# Altium schematic symbol library jlcpcb_2025_04_inductors_extended_0402.schlib: 1396 symbols (part 8 of 8)
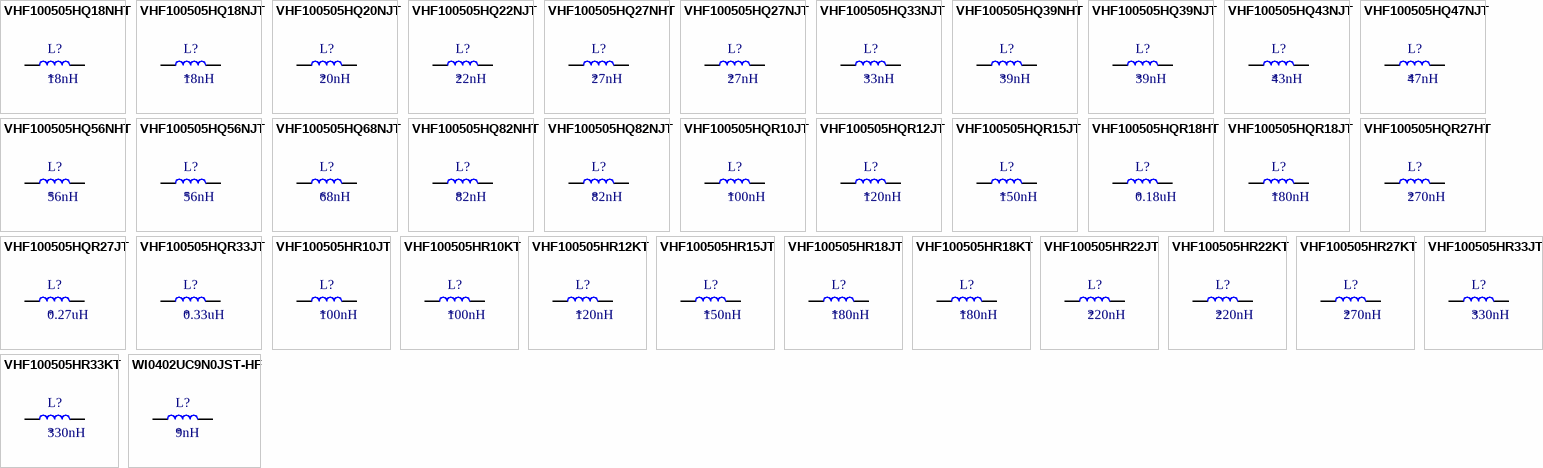
[diagram p41: symbols VHF100505HQ18NHT to WI0402UC9N0JST-HF]

## VHF100505HQ47NJT
designator L?  Inductance: 47nH
Inductor, 47nH, ±5%, 1.1Ω, 200mA, SMD 0402; Manufacturer: FH(Guangdong Fenghua Advanced Tech); Manufacturer Part Number: VHF100505HQ47NJT; Package Size: 0402; JLCPCB Basic Part: No; JLCPCB Part Number: C395068; Supplier 1: LCSC; Category: Inductors; Supplier Part Number 1: C395068; Tolerance: ±5%; Rated Current: 200mA; DC Resistance: 1.1Ω; RoHS: Yes; ComponentLink1Description: Datasheet; ComponentLink1URL: https://wmsc.lcsc.com/wmsc/upload/file/pdf/v2/lcsc/2302231208_FH--Guangdong-Fenghua-Advanced-Tech-VHF100505HQ47NJT_C395068.pdf; ComponentLink2Description: JLCPCB Part URL; ComponentLink2URL: https://jlcpcb.com/partdetail/C395068; ComponentLink3Description: LCSC Part URL; ComponentLink3URL: https://lcsc.com/product-detail/Inductors-SMD_FH-Guangdong-Fenghua-Advanced-Tech-FH-Guangdong-Fenghua-Advanced-Tech-VHF100505HQ47NJT_C395068.html
footprint IND-0402 (0402 (1005M) Inductor)
pins: 1, 2

## VHF100505HQ56NHT
designator L?  Inductance: 56nH
Inductor, 56nH, ±3%, SMD 0402; Manufacturer: FH (Guangdong Fenghua Advanced Tech); Manufacturer Part Number: VHF100505HQ56NHT; Package Size: 0402; JLCPCB Basic Part: No; JLCPCB Part Number: C3032793; Supplier 1: LCSC; Category: Inductors; Supplier Part Number 1: C3032793; Tolerance: ±3%; RoHS: Yes; ComponentLink1Description: Datasheet; ComponentLink1URL: https://wmsc.lcsc.com/wmsc/upload/file/pdf/v2/lcsc/2302231130_FH--Guangdong-Fenghua-Advanced-Tech-VHF100505HQ56NHT_C3032793.pdf; ComponentLink2Description: JLCPCB Part URL; ComponentLink2URL: https://jlcpcb.com/partdetail/C3032793; ComponentLink3Description: LCSC Part URL; ComponentLink3URL: https://lcsc.com/product-detail/Inductors-SMD_FH-Guangdong-Fenghua-Advanced-Tech-FH-Guangdong-Fenghua-Advanced-Tech-VHF100505HQ56NHT_C3032793.html
footprint IND-0402 (0402 (1005M) Inductor)
pins: 1, 2

## VHF100505HQ56NJT
designator L?  Inductance: 56nH
Inductor, 56nH, ±5%, 1.2Ω, 200mA, SMD 0402; Manufacturer: FH(Guangdong Fenghua Advanced Tech); Manufacturer Part Number: VHF100505HQ56NJT; Package Size: 0402; JLCPCB Basic Part: No; JLCPCB Part Number: C395071; Supplier 1: LCSC; Category: Inductors; Supplier Part Number 1: C395071; Tolerance: ±5%; Rated Current: 200mA; DC Resistance: 1.2Ω; RoHS: Yes; ComponentLink1Description: Datasheet; ComponentLink1URL: https://wmsc.lcsc.com/wmsc/upload/file/pdf/v2/lcsc/2302231208_FH--Guangdong-Fenghua-Advanced-Tech-VHF100505HQ56NJT_C395071.pdf; ComponentLink2Description: JLCPCB Part URL; ComponentLink2URL: https://jlcpcb.com/partdetail/C395071; ComponentLink3Description: LCSC Part URL; ComponentLink3URL: https://lcsc.com/product-detail/Inductors-SMD_FH-Guangdong-Fenghua-Advanced-Tech-FH-Guangdong-Fenghua-Advanced-Tech-VHF100505HQ56NJT_C395071.html
footprint IND-0402 (0402 (1005M) Inductor)
pins: 1, 2

## VHF100505HQ68NJT
designator L?  Inductance: 68nH
Inductor, 68nH, ±5%, 1.4Ω, 180mA, SMD 0402; Manufacturer: FH(Guangdong Fenghua Advanced Tech); Manufacturer Part Number: VHF100505HQ68NJT; Package Size: 0402; JLCPCB Basic Part: No; JLCPCB Part Number: C391307; Supplier 1: LCSC; Category: Inductors; Supplier Part Number 1: C391307; Tolerance: ±5%; Rated Current: 180mA; DC Resistance: 1.4Ω; RoHS: Yes; ComponentLink1Description: Datasheet; ComponentLink1URL: https://wmsc.lcsc.com/wmsc/upload/file/pdf/v2/lcsc/2302231208_FH--Guangdong-Fenghua-Advanced-Tech-VHF100505HQ68NJT_C391307.pdf; ComponentLink2Description: JLCPCB Part URL; ComponentLink2URL: https://jlcpcb.com/partdetail/C391307; ComponentLink3Description: LCSC Part URL; ComponentLink3URL: https://lcsc.com/product-detail/Inductors-SMD_FH-Guangdong-Fenghua-Advanced-Tech-FH-Guangdong-Fenghua-Advanced-Tech-VHF100505HQ68NJT_C391307.html
footprint IND-0402 (0402 (1005M) Inductor)
pins: 1, 2

## VHF100505HQ82NHT
designator L?  Inductance: 82nH
Inductor, 82nH, ±3%, SMD 0402; Manufacturer: FH (Guangdong Fenghua Advanced Tech); Manufacturer Part Number: VHF100505HQ82NHT; Package Size: 0402; JLCPCB Basic Part: No; JLCPCB Part Number: C3032780; Supplier 1: LCSC; Category: Inductors; Supplier Part Number 1: C3032780; Tolerance: ±3%; RoHS: Yes; ComponentLink1Description: Datasheet; ComponentLink1URL: https://wmsc.lcsc.com/wmsc/upload/file/pdf/v2/lcsc/2302231130_FH--Guangdong-Fenghua-Advanced-Tech-VHF100505HQ82NHT_C3032780.pdf; ComponentLink2Description: JLCPCB Part URL; ComponentLink2URL: https://jlcpcb.com/partdetail/C3032780; ComponentLink3Description: LCSC Part URL; ComponentLink3URL: https://lcsc.com/product-detail/Inductors-SMD_FH-Guangdong-Fenghua-Advanced-Tech-FH-Guangdong-Fenghua-Advanced-Tech-VHF100505HQ82NHT_C3032780.html
footprint IND-0402 (0402 (1005M) Inductor)
pins: 1, 2

## VHF100505HQ82NJT
designator L?  Inductance: 82nH
Inductor, 82nH, ±5%, 2.4Ω, 150mA, SMD 0402; Manufacturer: FH(Guangdong Fenghua Advanced Tech); Manufacturer Part Number: VHF100505HQ82NJT; Package Size: 0402; JLCPCB Basic Part: No; JLCPCB Part Number: C395076; Supplier 1: LCSC; Category: Inductors; Supplier Part Number 1: C395076; Tolerance: ±5%; Rated Current: 150mA; DC Resistance: 2.4Ω; RoHS: Yes; ComponentLink1Description: Datasheet; ComponentLink1URL: https://wmsc.lcsc.com/wmsc/upload/file/pdf/v2/lcsc/2302231208_FH--Guangdong-Fenghua-Advanced-Tech-VHF100505HQ82NJT_C395076.pdf; ComponentLink2Description: JLCPCB Part URL; ComponentLink2URL: https://jlcpcb.com/partdetail/C395076; ComponentLink3Description: LCSC Part URL; ComponentLink3URL: https://lcsc.com/product-detail/Inductors-SMD_FH-Guangdong-Fenghua-Advanced-Tech-FH-Guangdong-Fenghua-Advanced-Tech-VHF100505HQ82NJT_C395076.html
footprint IND-0402 (0402 (1005M) Inductor)
pins: 1, 2

## VHF100505HQR10JT
designator L?  Inductance: 100nH
Inductor, 100nH, ±5%, 2.6Ω, 150mA, SMD 0402; Manufacturer: FH(Guangdong Fenghua Advanced Tech); Manufacturer Part Number: VHF100505HQR10JT; Package Size: 0402; JLCPCB Basic Part: No; JLCPCB Part Number: C395078; Supplier 1: LCSC; Category: Inductors; Supplier Part Number 1: C395078; Tolerance: ±5%; Rated Current: 150mA; DC Resistance: 2.6Ω; RoHS: Yes; ComponentLink1Description: Datasheet; ComponentLink1URL: https://wmsc.lcsc.com/wmsc/upload/file/pdf/v2/lcsc/2302231208_FH--Guangdong-Fenghua-Advanced-Tech-VHF100505HQR10JT_C395078.pdf; ComponentLink2Description: JLCPCB Part URL; ComponentLink2URL: https://jlcpcb.com/partdetail/C395078; ComponentLink3Description: LCSC Part URL; ComponentLink3URL: https://lcsc.com/product-detail/Inductors-SMD_FH-Guangdong-Fenghua-Advanced-Tech-FH-Guangdong-Fenghua-Advanced-Tech-VHF100505HQR10JT_C395078.html
footprint IND-0402 (0402 (1005M) Inductor)
pins: 1, 2

## VHF100505HQR12JT
designator L?  Inductance: 120nH
Inductor, 120nH, ±5%, 2.8Ω, 150mA, SMD 0402; Manufacturer: FH(Guangdong Fenghua Advanced Tech); Manufacturer Part Number: VHF100505HQR12JT; Package Size: 0402; JLCPCB Basic Part: No; JLCPCB Part Number: C268315; Supplier 1: LCSC; Category: Inductors; Supplier Part Number 1: C268315; Tolerance: ±5%; Rated Current: 150mA; DC Resistance: 2.8Ω; RoHS: Yes; ComponentLink1Description: Datasheet; ComponentLink1URL: https://wmsc.lcsc.com/wmsc/upload/file/pdf/v2/lcsc/2302231230_FH--Guangdong-Fenghua-Advanced-Tech-VHF100505HQR12JT_C268315.pdf; ComponentLink2Description: JLCPCB Part URL; ComponentLink2URL: https://jlcpcb.com/partdetail/C268315; ComponentLink3Description: LCSC Part URL; ComponentLink3URL: https://lcsc.com/product-detail/Inductors-SMD_FH-Guangdong-Fenghua-Advanced-Tech-FH-Guangdong-Fenghua-Advanced-Tech-VHF100505HQR12JT_C268315.html
footprint IND-0402 (0402 (1005M) Inductor)
pins: 1, 2

## VHF100505HQR15JT
designator L?  Inductance: 150nH
Inductor, 150nH, ±5%, 3.2Ω, 100mA, SMD 0402; Manufacturer: FH(Guangdong Fenghua Advanced Tech); Manufacturer Part Number: VHF100505HQR15JT; Package Size: 0402; JLCPCB Basic Part: No; JLCPCB Part Number: C268316; Supplier 1: LCSC; Category: Inductors; Supplier Part Number 1: C268316; Tolerance: ±5%; Rated Current: 100mA; DC Resistance: 3.2Ω; RoHS: Yes; ComponentLink1Description: Datasheet; ComponentLink1URL: https://wmsc.lcsc.com/wmsc/upload/file/pdf/v2/lcsc/2302231230_FH--Guangdong-Fenghua-Advanced-Tech-VHF100505HQR15JT_C268316.pdf; ComponentLink2Description: JLCPCB Part URL; ComponentLink2URL: https://jlcpcb.com/partdetail/C268316; ComponentLink3Description: LCSC Part URL; ComponentLink3URL: https://lcsc.com/product-detail/Inductors-SMD_FH-Guangdong-Fenghua-Advanced-Tech-FH-Guangdong-Fenghua-Advanced-Tech-VHF100505HQR15JT_C268316.html
footprint IND-0402 (0402 (1005M) Inductor)
pins: 1, 2

## VHF100505HQR18HT
designator L?  Inductance: 0.18uH
Inductor, 0.18uH, ±3%, SMD 0402; Manufacturer: FH (Guangdong Fenghua Advanced Tech); Manufacturer Part Number: VHF100505HQR18HT; Package Size: 0402; JLCPCB Basic Part: No; JLCPCB Part Number: C3032808; Supplier 1: LCSC; Category: Inductors; Supplier Part Number 1: C3032808; Tolerance: ±3%; RoHS: Yes; ComponentLink1Description: Datasheet; ComponentLink1URL: https://wmsc.lcsc.com/wmsc/upload/file/pdf/v2/lcsc/2302231030_FH--Guangdong-Fenghua-Advanced-Tech-VHF100505HQR18HT_C3032808.pdf; ComponentLink2Description: JLCPCB Part URL; ComponentLink2URL: https://jlcpcb.com/partdetail/C3032808; ComponentLink3Description: LCSC Part URL; ComponentLink3URL: https://lcsc.com/product-detail/Inductors-SMD_FH-Guangdong-Fenghua-Advanced-Tech-FH-Guangdong-Fenghua-Advanced-Tech-VHF100505HQR18HT_C3032808.html
footprint IND-0402 (0402 (1005M) Inductor)
pins: 1, 2

## VHF100505HQR18JT
designator L?  Inductance: 180nH
Inductor, 180nH, ±5%, 3.7Ω, 100mA, SMD 0402; Manufacturer: FH(Guangdong Fenghua Advanced Tech); Manufacturer Part Number: VHF100505HQR18JT; Package Size: 0402; JLCPCB Basic Part: No; JLCPCB Part Number: C395079; Supplier 1: LCSC; Category: Inductors; Supplier Part Number 1: C395079; Tolerance: ±5%; Rated Current: 100mA; DC Resistance: 3.7Ω; RoHS: Yes; ComponentLink1Description: Datasheet; ComponentLink1URL: https://wmsc.lcsc.com/wmsc/upload/file/pdf/v2/lcsc/2302231208_FH--Guangdong-Fenghua-Advanced-Tech-VHF100505HQR18JT_C395079.pdf; ComponentLink2Description: JLCPCB Part URL; ComponentLink2URL: https://jlcpcb.com/partdetail/C395079; ComponentLink3Description: LCSC Part URL; ComponentLink3URL: https://lcsc.com/product-detail/Inductors-SMD_FH-Guangdong-Fenghua-Advanced-Tech-FH-Guangdong-Fenghua-Advanced-Tech-VHF100505HQR18JT_C395079.html
footprint IND-0402 (0402 (1005M) Inductor)
pins: 1, 2

## VHF100505HQR27HT
designator L?  Inductance: 270nH
Inductor, 270nH, ±3%, SMD 0402; Manufacturer: FH (Guangdong Fenghua Advanced Tech); Manufacturer Part Number: VHF100505HQR27HT; Package Size: 0402; JLCPCB Basic Part: No; JLCPCB Part Number: C3032704; Supplier 1: LCSC; Category: Inductors; Supplier Part Number 1: C3032704; Tolerance: ±3%; RoHS: Yes; ComponentLink1Description: Datasheet; ComponentLink1URL: https://wmsc.lcsc.com/wmsc/upload/file/pdf/v2/lcsc/2302231130_FH--Guangdong-Fenghua-Advanced-Tech-VHF100505HQR27HT_C3032704.pdf; ComponentLink2Description: JLCPCB Part URL; ComponentLink2URL: https://jlcpcb.com/partdetail/C3032704; ComponentLink3Description: LCSC Part URL; ComponentLink3URL: https://lcsc.com/product-detail/Inductors-SMD_FH-Guangdong-Fenghua-Advanced-Tech-FH-Guangdong-Fenghua-Advanced-Tech-VHF100505HQR27HT_C3032704.html
footprint IND-0402 (0402 (1005M) Inductor)
pins: 1, 2

## VHF100505HQR27JT
designator L?  Inductance: 0.27uH
Inductor, 0.27uH, ±5%, 4.5Ω, 100mA, SMD 0402; Manufacturer: FH (Guangdong Fenghua Advanced Tech); Manufacturer Part Number: VHF100505HQR27JT; Self-Resonant Frequency: 400MHz; Q Factor: 8@100MHz; Package Size: 0402; JLCPCB Basic Part: No; JLCPCB Part Number: C485774; Supplier 1: LCSC; Category: Inductors; Supplier Part Number 1: C485774; Tolerance: ±5%; Rated Current: 100mA; DC Resistance: 4.5Ω; RoHS: Yes; ComponentLink1Description: Datasheet; ComponentLink1URL: https://wmsc.lcsc.com/wmsc/upload/file/pdf/v2/lcsc/2302231130_FH--Guangdong-Fenghua-Advanced-Tech-VHF100505HQR27JT_C485774.pdf; ComponentLink2Description: JLCPCB Part URL; ComponentLink2URL: https://jlcpcb.com/partdetail/C485774; ComponentLink3Description: LCSC Part URL; ComponentLink3URL: https://lcsc.com/product-detail/Inductors-SMD_FH-Guangdong-Fenghua-Advanced-Tech-FH-Guangdong-Fenghua-Advanced-Tech-VHF100505HQR27JT_C485774.html
footprint IND-0402 (0402 (1005M) Inductor)
pins: 1, 2

## VHF100505HQR33JT
designator L?  Inductance: 0.33uH
Inductor, 0.33uH, ±5%, 7Ω, 50mA, SMD 0402; Manufacturer: FH (Guangdong Fenghua Advanced Tech); Manufacturer Part Number: VHF100505HQR33JT; Self-Resonant Frequency: 350MHz; Q Factor: 6@50MHz; Package Size: 0402; JLCPCB Basic Part: No; JLCPCB Part Number: C485776; Supplier 1: LCSC; Category: Inductors; Supplier Part Number 1: C485776; Tolerance: ±5%; Rated Current: 50mA; DC Resistance: 7Ω; RoHS: Yes; ComponentLink1Description: Datasheet; ComponentLink1URL: https://wmsc.lcsc.com/wmsc/upload/file/pdf/v2/lcsc/2302231130_FH--Guangdong-Fenghua-Advanced-Tech-VHF100505HQR33JT_C485776.pdf; ComponentLink2Description: JLCPCB Part URL; ComponentLink2URL: https://jlcpcb.com/partdetail/C485776; ComponentLink3Description: LCSC Part URL; ComponentLink3URL: https://lcsc.com/product-detail/Inductors-SMD_FH-Guangdong-Fenghua-Advanced-Tech-FH-Guangdong-Fenghua-Advanced-Tech-VHF100505HQR33JT_C485776.html
footprint IND-0402 (0402 (1005M) Inductor)
pins: 1, 2

## VHF100505HR10JT
designator L?  Inductance: 100nH
Inductor, 100nH, ±5%, SMD 0402; Manufacturer: FH(Guangdong Fenghua Advanced Tech); Manufacturer Part Number: VHF100505HR10JT; Package Size: 0402; JLCPCB Basic Part: No; JLCPCB Part Number: C90184; Supplier 1: LCSC; Category: Inductors; Supplier Part Number 1: C90184; Tolerance: ±5%; RoHS: Yes; ComponentLink1Description: Datasheet; ComponentLink1URL: https://wmsc.lcsc.com/wmsc/upload/file/pdf/v2/lcsc/2304140030_FH--Guangdong-Fenghua-Advanced-Tech-VHF100505HR10JT_C90184.pdf; ComponentLink2Description: JLCPCB Part URL; ComponentLink2URL: https://jlcpcb.com/partdetail/C90184; ComponentLink3Description: LCSC Part URL; ComponentLink3URL: https://lcsc.com/product-detail/Inductors-SMD_FH-Guangdong-Fenghua-Advanced-Tech-FH-Guangdong-Fenghua-Advanced-Tech-VHF100505HR10JT_C90184.html
footprint IND-0402 (0402 (1005M) Inductor)
pins: 1, 2

## VHF100505HR10KT
designator L?  Inductance: 100nH
Inductor, 100nH, ±10%, 2.6Ω, 150mA, SMD 0402; Manufacturer: FH(Guangdong Fenghua Advanced Tech); Manufacturer Part Number: VHF100505HR10KT; Package Size: 0402; JLCPCB Basic Part: No; JLCPCB Part Number: C381892; Supplier 1: LCSC; Category: Inductors; Supplier Part Number 1: C381892; Tolerance: ±10%; Rated Current: 150mA; DC Resistance: 2.6Ω; RoHS: Yes; ComponentLink1Description: Datasheet; ComponentLink1URL: https://wmsc.lcsc.com/wmsc/upload/file/pdf/v2/lcsc/2304140030_FH--Guangdong-Fenghua-Advanced-Tech-VHF100505HR10KT_C381892.pdf; ComponentLink2Description: JLCPCB Part URL; ComponentLink2URL: https://jlcpcb.com/partdetail/C381892; ComponentLink3Description: LCSC Part URL; ComponentLink3URL: https://lcsc.com/product-detail/Inductors-SMD_FH-Guangdong-Fenghua-Advanced-Tech-FH-Guangdong-Fenghua-Advanced-Tech-VHF100505HR10KT_C381892.html
footprint IND-0402 (0402 (1005M) Inductor)
pins: 1, 2

## VHF100505HR12KT
designator L?  Inductance: 120nH
Inductor, 120nH, ±10%, 2.8Ω, 150mA, SMD 0402; Manufacturer: FH(Guangdong Fenghua Advanced Tech); Manufacturer Part Number: VHF100505HR12KT; Package Size: 0402; JLCPCB Basic Part: No; JLCPCB Part Number: C381893; Supplier 1: LCSC; Category: Inductors; Supplier Part Number 1: C381893; Tolerance: ±10%; Rated Current: 150mA; DC Resistance: 2.8Ω; RoHS: Yes; ComponentLink1Description: Datasheet; ComponentLink1URL: https://wmsc.lcsc.com/wmsc/upload/file/pdf/v2/lcsc/2304140030_FH--Guangdong-Fenghua-Advanced-Tech-VHF100505HR12KT_C381893.pdf; ComponentLink2Description: JLCPCB Part URL; ComponentLink2URL: https://jlcpcb.com/partdetail/C381893; ComponentLink3Description: LCSC Part URL; ComponentLink3URL: https://lcsc.com/product-detail/Inductors-SMD_FH-Guangdong-Fenghua-Advanced-Tech-FH-Guangdong-Fenghua-Advanced-Tech-VHF100505HR12KT_C381893.html
footprint IND-0402 (0402 (1005M) Inductor)
pins: 1, 2

## VHF100505HR15JT
designator L?  Inductance: 150nH
Inductor, 150nH, ±5%, 3.2Ω, 100mA, SMD 0402; Manufacturer: FH(Guangdong Fenghua Advanced Tech); Manufacturer Part Number: VHF100505HR15JT; Package Size: 0402; JLCPCB Basic Part: No; JLCPCB Part Number: C305251; Supplier 1: LCSC; Category: Inductors; Supplier Part Number 1: C305251; Tolerance: ±5%; Rated Current: 100mA; DC Resistance: 3.2Ω; RoHS: Yes; ComponentLink1Description: Datasheet; ComponentLink1URL: https://wmsc.lcsc.com/wmsc/upload/file/pdf/v2/lcsc/1912111437_FH--Guangdong-Fenghua-Advanced-Tech-VHF100505HR15JT_C305251.pdf; ComponentLink2Description: JLCPCB Part URL; ComponentLink2URL: https://jlcpcb.com/partdetail/C305251; ComponentLink3Description: LCSC Part URL; ComponentLink3URL: https://lcsc.com/product-detail/Inductors-SMD_FH-Guangdong-Fenghua-Advanced-Tech-FH-Guangdong-Fenghua-Advanced-Tech-VHF100505HR15JT_C305251.html
footprint IND-0402 (0402 (1005M) Inductor)
pins: 1, 2

## VHF100505HR18JT
designator L?  Inductance: 180nH
Inductor, 180nH, ±5%, 3.7Ω, 100mA, SMD 0402; Manufacturer: FH(Guangdong Fenghua Advanced Tech); Manufacturer Part Number: VHF100505HR18JT; Package Size: 0402; JLCPCB Basic Part: No; JLCPCB Part Number: C381848; Supplier 1: LCSC; Category: Inductors; Supplier Part Number 1: C381848; Tolerance: ±5%; Rated Current: 100mA; DC Resistance: 3.7Ω; RoHS: Yes; ComponentLink1Description: Datasheet; ComponentLink1URL: https://wmsc.lcsc.com/wmsc/upload/file/pdf/v2/lcsc/2304140030_FH--Guangdong-Fenghua-Advanced-Tech-VHF100505HR18JT_C381848.pdf; ComponentLink2Description: JLCPCB Part URL; ComponentLink2URL: https://jlcpcb.com/partdetail/C381848; ComponentLink3Description: LCSC Part URL; ComponentLink3URL: https://lcsc.com/product-detail/Inductors-SMD_FH-Guangdong-Fenghua-Advanced-Tech-FH-Guangdong-Fenghua-Advanced-Tech-VHF100505HR18JT_C381848.html
footprint IND-0402 (0402 (1005M) Inductor)
pins: 1, 2

## VHF100505HR18KT
designator L?  Inductance: 180nH
Inductor, 180nH, ±10%, 3.7Ω, 100mA, SMD 0402; Manufacturer: FH(Guangdong Fenghua Advanced Tech); Manufacturer Part Number: VHF100505HR18KT; Package Size: 0402; JLCPCB Basic Part: No; JLCPCB Part Number: C381894; Supplier 1: LCSC; Category: Inductors; Supplier Part Number 1: C381894; Tolerance: ±10%; Rated Current: 100mA; DC Resistance: 3.7Ω; RoHS: Yes; ComponentLink1Description: Datasheet; ComponentLink1URL: https://wmsc.lcsc.com/wmsc/upload/file/pdf/v2/lcsc/2304140030_FH--Guangdong-Fenghua-Advanced-Tech-VHF100505HR18KT_C381894.pdf; ComponentLink2Description: JLCPCB Part URL; ComponentLink2URL: https://jlcpcb.com/partdetail/C381894; ComponentLink3Description: LCSC Part URL; ComponentLink3URL: https://lcsc.com/product-detail/Inductors-SMD_FH-Guangdong-Fenghua-Advanced-Tech-FH-Guangdong-Fenghua-Advanced-Tech-VHF100505HR18KT_C381894.html
footprint IND-0402 (0402 (1005M) Inductor)
pins: 1, 2

## VHF100505HR22JT
designator L?  Inductance: 220nH
Inductor, 220nH, ±5%, 4Ω, 100mA, SMD 0402; Manufacturer: FH(Guangdong Fenghua Advanced Tech); Manufacturer Part Number: VHF100505HR22JT; Package Size: 0402; JLCPCB Basic Part: No; JLCPCB Part Number: C381849; Supplier 1: LCSC; Category: Inductors; Supplier Part Number 1: C381849; Tolerance: ±5%; Rated Current: 100mA; DC Resistance: 4Ω; RoHS: Yes; ComponentLink1Description: Datasheet; ComponentLink1URL: https://wmsc.lcsc.com/wmsc/upload/file/pdf/v2/lcsc/2304140030_FH--Guangdong-Fenghua-Advanced-Tech-VHF100505HR22JT_C381849.pdf; ComponentLink2Description: JLCPCB Part URL; ComponentLink2URL: https://jlcpcb.com/partdetail/C381849; ComponentLink3Description: LCSC Part URL; ComponentLink3URL: https://lcsc.com/product-detail/Inductors-SMD_FH-Guangdong-Fenghua-Advanced-Tech-FH-Guangdong-Fenghua-Advanced-Tech-VHF100505HR22JT_C381849.html
footprint IND-0402 (0402 (1005M) Inductor)
pins: 1, 2

## VHF100505HR22KT
designator L?  Inductance: 220nH
Inductor, 220nH, ±10%, 4Ω, 100mA, SMD 0402; Manufacturer: FH(Guangdong Fenghua Advanced Tech); Manufacturer Part Number: VHF100505HR22KT; Package Size: 0402; JLCPCB Basic Part: No; JLCPCB Part Number: C381895; Supplier 1: LCSC; Category: Inductors; Supplier Part Number 1: C381895; Tolerance: ±10%; Rated Current: 100mA; DC Resistance: 4Ω; RoHS: Yes; ComponentLink1Description: Datasheet; ComponentLink1URL: https://wmsc.lcsc.com/wmsc/upload/file/pdf/v2/lcsc/2304140030_FH--Guangdong-Fenghua-Advanced-Tech-VHF100505HR22KT_C381895.pdf; ComponentLink2Description: JLCPCB Part URL; ComponentLink2URL: https://jlcpcb.com/partdetail/C381895; ComponentLink3Description: LCSC Part URL; ComponentLink3URL: https://lcsc.com/product-detail/Inductors-SMD_FH-Guangdong-Fenghua-Advanced-Tech-FH-Guangdong-Fenghua-Advanced-Tech-VHF100505HR22KT_C381895.html
footprint IND-0402 (0402 (1005M) Inductor)
pins: 1, 2

## VHF100505HR27KT
designator L?  Inductance: 270nH
Inductor, 270nH, ±10%, 4.5Ω, 100mA, SMD 0402; Manufacturer: FH(Guangdong Fenghua Advanced Tech); Manufacturer Part Number: VHF100505HR27KT; Package Size: 0402; JLCPCB Basic Part: No; JLCPCB Part Number: C381896; Supplier 1: LCSC; Category: Inductors; Supplier Part Number 1: C381896; Tolerance: ±10%; Rated Current: 100mA; DC Resistance: 4.5Ω; RoHS: Yes; ComponentLink1Description: Datasheet; ComponentLink1URL: https://wmsc.lcsc.com/wmsc/upload/file/pdf/v2/lcsc/2304140030_FH--Guangdong-Fenghua-Advanced-Tech-VHF100505HR27KT_C381896.pdf; ComponentLink2Description: JLCPCB Part URL; ComponentLink2URL: https://jlcpcb.com/partdetail/C381896; ComponentLink3Description: LCSC Part URL; ComponentLink3URL: https://lcsc.com/product-detail/Inductors-SMD_FH-Guangdong-Fenghua-Advanced-Tech-FH-Guangdong-Fenghua-Advanced-Tech-VHF100505HR27KT_C381896.html
footprint IND-0402 (0402 (1005M) Inductor)
pins: 1, 2

## VHF100505HR33JT
designator L?  Inductance: 330nH
Inductor, 330nH, ±5%, 7Ω, 50mA, SMD 0402; Manufacturer: FH(Guangdong Fenghua Advanced Tech); Manufacturer Part Number: VHF100505HR33JT; Package Size: 0402; JLCPCB Basic Part: No; JLCPCB Part Number: C381852; Supplier 1: LCSC; Category: Inductors; Supplier Part Number 1: C381852; Tolerance: ±5%; Rated Current: 50mA; DC Resistance: 7Ω; RoHS: Yes; ComponentLink1Description: Datasheet; ComponentLink1URL: https://wmsc.lcsc.com/wmsc/upload/file/pdf/v2/lcsc/2304140030_FH--Guangdong-Fenghua-Advanced-Tech-VHF100505HR33JT_C381852.pdf; ComponentLink2Description: JLCPCB Part URL; ComponentLink2URL: https://jlcpcb.com/partdetail/C381852; ComponentLink3Description: LCSC Part URL; ComponentLink3URL: https://lcsc.com/product-detail/Inductors-SMD_FH-Guangdong-Fenghua-Advanced-Tech-FH-Guangdong-Fenghua-Advanced-Tech-VHF100505HR33JT_C381852.html
footprint IND-0402 (0402 (1005M) Inductor)
pins: 1, 2

## VHF100505HR33KT
designator L?  Inductance: 330nH
Inductor, 330nH, ±10%, 7Ω, 50mA, SMD 0402; Manufacturer: FH(Guangdong Fenghua Advanced Tech); Manufacturer Part Number: VHF100505HR33KT; Package Size: 0402; JLCPCB Basic Part: No; JLCPCB Part Number: C381898; Supplier 1: LCSC; Category: Inductors; Supplier Part Number 1: C381898; Tolerance: ±10%; Rated Current: 50mA; DC Resistance: 7Ω; RoHS: Yes; ComponentLink1Description: Datasheet; ComponentLink1URL: https://wmsc.lcsc.com/wmsc/upload/file/pdf/v2/lcsc/2304140030_FH--Guangdong-Fenghua-Advanced-Tech-VHF100505HR33KT_C381898.pdf; ComponentLink2Description: JLCPCB Part URL; ComponentLink2URL: https://jlcpcb.com/partdetail/C381898; ComponentLink3Description: LCSC Part URL; ComponentLink3URL: https://lcsc.com/product-detail/Inductors-SMD_FH-Guangdong-Fenghua-Advanced-Tech-FH-Guangdong-Fenghua-Advanced-Tech-VHF100505HR33KT_C381898.html
footprint IND-0402 (0402 (1005M) Inductor)
pins: 1, 2

## WI0402UC9N0JST-HF
designator L?  Inductance: 9nH
Inductor, 9nH, ±5%, 150mΩ, 680mA, SMD 0402; Manufacturer: DDY; Manufacturer Part Number: WI0402UC9N0JST-HF; Package Size: 0402; JLCPCB Basic Part: No; JLCPCB Part Number: C18221144; Supplier 1: LCSC; Category: Inductors; Supplier Part Number 1: C18221144; Tolerance: ±5%; Rated Current: 680mA; DC Resistance: 150mΩ; RoHS: Yes; ComponentLink1Description: Datasheet; ComponentLink1URL: https://wmsc.lcsc.com/wmsc/upload/file/pdf/v2/lcsc/2310111507_DDY-WI0402UC9N0JST-HF_C18221144.pdf; ComponentLink2Description: JLCPCB Part URL; ComponentLink2URL: https://jlcpcb.com/partdetail/C18221144; ComponentLink3Description: LCSC Part URL; ComponentLink3URL: https://lcsc.com/product-detail/Inductors-SMD_DDY-DDY-WI0402UC9N0JST-HF_C18221144.html
footprint IND-0402 (0402 (1005M) Inductor)
pins: 1, 2